# Altium footprint library SoM_Artix.PcbLib: 239 footprints (part 10 of 15)
Each footprint in its own frame and in the unit in brackets; x right, y up, seen from the top. Pads: shape width x height; smd on the part's side, far side on the other; paste and mask are expansions set on the pad; w line width, h text height; cw(c..) or ccw(c..) is an arc to the next point about the centre after c.
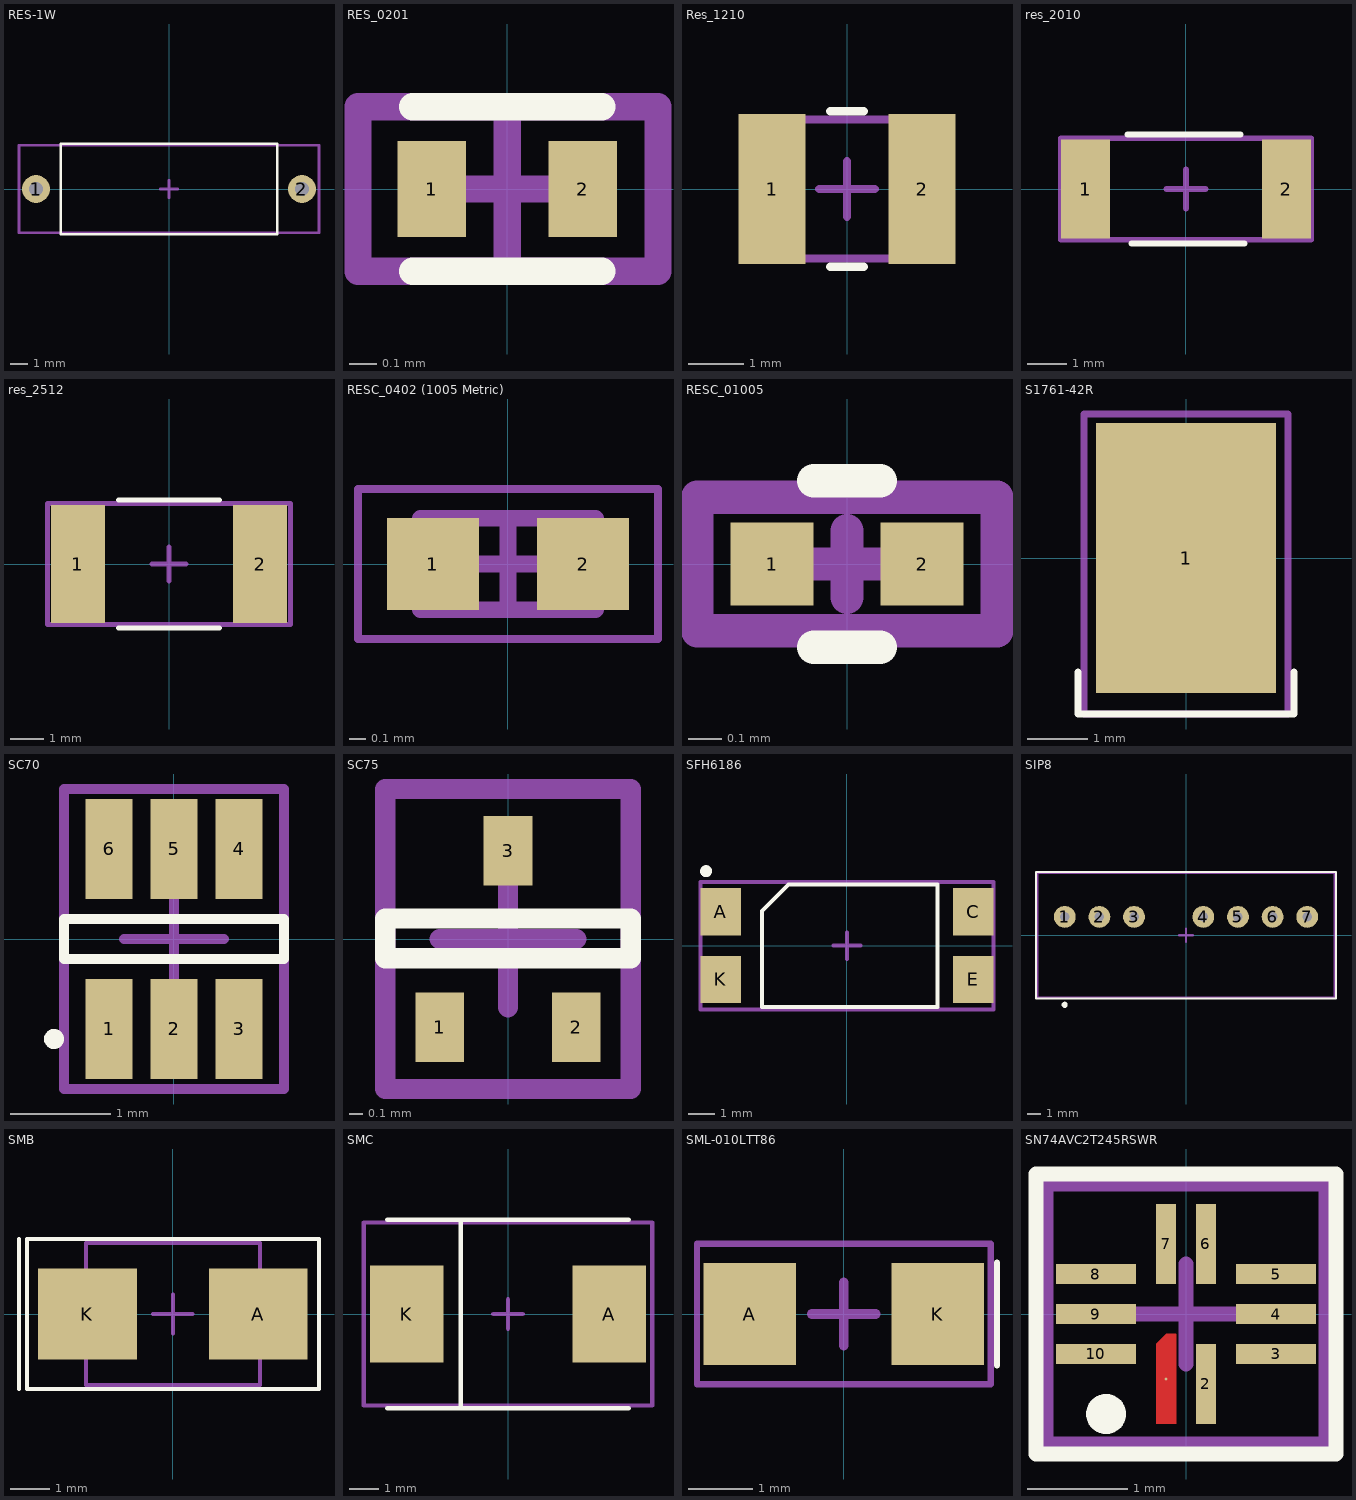
[diagram p9: the footprints below, top view; thin cyan lines are the x and y axes]

## RES-1W [mm]
pads (2):
  round 1.6 hole 0.8: 1(-7.625,0) 2(7.625,0)
Top Overlay:
  lines w0.15: -6.2,-2.6 6.2,-2.6 6.2,2.6 -6.2,2.6 -6.2,-2.6
Mechanical 13:
  lines w0.15: -0.5,0 0.5,0 ; 0,-0.5 0,0.5 ; -8.6,-2.5 -8.6,2.5 8.6,2.5 8.6,-2.5 -8.6,-2.5
3D body "User Library-RES-1W.STEP": height 5, standoff -3, extent -7.975,-2.503 7.965,2.497

## RES_0201 [mm]
pads (2):
  rect 0.25x0.35 smd mask+0.03: 1(-0.275,0) 2(0.275,0)
Top Overlay:
  lines w0.1: -0.345,-0.3 0.345,-0.3 ; -0.345,0.3 0.345,0.3
Mechanical 15:
  lines w0.1: -0.3,0 0.3,0 ; 0,-0.3 0,0.3 ; -0.545,-0.3 0.55,-0.3 0.55,0.3 -0.545,0.3 -0.545,-0.3
3D body "User Library-User Library-RES0201.step": height 0.15, standoff 0, extent -0.245,-0.15 0.355,0.15

## Res_1210 [mm]
height 1.8
pads (2):
  rect 1.2x2.7 smd: 1(-1.35,0) 2(1.35,0)
Top Overlay:
  lines w0.15: -0.3,-1.4 0.3,-1.4 ; -0.3,1.4 0.3,1.4
Mechanical 13:
  lines w0.15: -0.5,0 0.5,0 ; 0,-0.5 0,0.5 ; -1.6,-1.25 1.6,-1.25 1.6,1.25 -1.6,1.25 -1.6,-1.25
3D body "User Library-RESC3225X06N.step": height 0.55, standoff 0, extent -1.6,-1.25 1.6,1.25

## res_2010 [mm]
pads (2):
  rect 1.25x2.54 smd: 1(-2.575,0) 2(2.575,0)
Top Overlay:
  lines w0.15: -1.5,1.4 1.4,1.4 ; -1.4,-1.4 1.5,-1.4
Mechanical 13:
  lines w0.15: -0.5,0 0.5,0 ; 0,-0.5 0,0.5 ; -3.2,-1.3 3.2,-1.3 3.2,1.3 -3.2,1.3 -3.2,-1.3
3D body "User Library-CRS2010.step": height 0.56, standoff 0, extent -2.5,-1.25 2.5,1.25

## res_2512 [mm]
pads (2):
  rect 1.6x3.5 smd: 1(-2.7,0) 2(2.7,0)
Top Overlay:
  lines w0.15: -1.5,-1.9 1.5,-1.9 ; -1.5,1.9 1.5,1.9
Mechanical 13:
  lines w0.15: -0.5,0 0.5,0 ; 0,-0.5 0,0.5 ; -3.6,-1.8 3.6,-1.8 3.6,1.8 -3.6,1.8 -3.6,-1.8
3D body "User Library-Resistor SMD 2512.step": height 0.65, standoff 0, extent -3.2,-1.6 3.2,1.6

## RESC_0402 (1005 Metric) [mm]
height 0.4
pads (2):
  rect 0.55x0.55 smd: 1(-0.45,0) 2(0.45,0)
Mechanical 13:
  lines w0.1: -0.525,-0.275 -0.525,0.275 0.525,0.275 0.525,-0.275 -0.525,-0.275
Mechanical 15:
  lines w0.05: -0.9,-0.45 -0.9,0.45 0.9,0.45 0.9,-0.45 -0.9,-0.45
  lines w0.1: -0.275,0 0.275,0 ; 0,-0.275 0,0.275
3D body "RESC1005X04N.step": height 0.4, standoff 0, extent -0.525,-0.275 0.525,0.275

## RESC_01005 [mm]
pads (2):
  rect 0.25x0.25 smd mask+0.05: 1(-0.225,0) 2(0.225,0)
Top Overlay:
  lines w0.1: -0.1,-0.25 0.1,-0.25 ; -0.1,0.25 0.1,0.25
Mechanical 15:
  lines w0.1: -0.1,0 0.1,0 ; 0,-0.1 0,0.1 ; -0.45,-0.2 -0.45,0.2 0.45,0.2 0.45,-0.2 -0.45,-0.2
3D body "User Library-01005_resistor.step": height 0.14, standoff 0, extent -0.2,-0.1 0.2,0.1

## S1761-42R [mm] "3.50mm SMT Spring Contact"
pads (1):
  rect 3x4.5 smd: 1(0,0)
Top Overlay:
  lines w0.11: -1.8,-1.9 -1.8,-2.6 1.8,-2.6 1.8,-1.9
Mechanical 13:
  lines w0.11: -1,0 1,0 ; 0,-1 0,1 ; -1.7,-2.6 1.7,-2.6 1.7,2.4 -1.7,2.4 -1.7,-2.6
3D body "s1761-42r.stp": height 3.51, standoff -0.01, extent -1.25,-2.5 1.25,1.999

## SC70 [mm]
pads (6):
  rect 0.47x1 smd mask+0.05: 1(-0.65,-0.9) 2(0,-0.9) 3(0.65,-0.9) 4(0.65,0.9) 5(0,0.9) 6(-0.65,0.9)
Top Overlay:
  circle w0.1: c-1.2,-1 r0.05
  lines w0.1: -1.1,-0.2 1.1,-0.2 1.1,0.2 -1.1,0.2 -1.1,-0.2
Mechanical 15:
  lines w0.1: -0.5,0 0.5,0 ; 0,-0.5 0,0.5 ; -1.1,-1.5 -1.1,1.5 1.1,1.5 1.1,-1.5 -1.1,-1.5
3D body "User Library-sot363.step": height 1, standoff 0, extent -1.05,-1.15 1.05,1.15

## SC75 [mil]
pads (3):
  rect 14.02x20 smd: 1(-19.68,-25.49) 2(19.69,-25.49) 3(0,25.49)
Top Overlay:
  lines w5.91: -35.43,-5.51 35.43,-5.51 35.43,5.92 -35.43,5.92 -35.43,-5.51
Mechanical 15:
  lines w5.91: -19.68,0 19.68,0 ; 0,-19.68 0,19.68 ; -35.43,-43.31 -35.43,43.31 35.43,43.31 35.43,-43.31 -35.43,-43.31
3D body "User Library-SC-75A.STEP": height 27.67, standoff -0.25, extent -31.5,-31.1 31.5,31.89

## SFH6186 [mm]
height 4.1
pads (4):
  rect 1.52x1.78 smd: A(-4.75,1.27) C(4.75,1.27) E(4.75,-1.27) K(-4.75,-1.27)
Top Overlay:
  circle w0.25: c-5.3,2.8 r0.1
  lines w0.15: -3.2,-2.3 -3.2,1.3 -2.2,2.3 3.4,2.3 3.4,-2.3 -3.2,-2.3
Mechanical 13:
  lines w0.15: -0.5,0 0.5,0 ; 0,-0.5 0,0.5 ; -5.5,-2.4 5.5,-2.4 5.5,2.4 -5.5,2.4 -5.5,-2.4
3D body "User Library-PC817_Gullwing.STEP": height 3.85, standoff 0, extent -5,-2.29 5,2.29

## SIP8 [mm]
height 11
pads (7):
  round 1.6 hole 0.7: 1(-8.89,1.35) 2(-6.35,1.35) 3(-3.81,1.35) 4(1.27,1.35) 5(3.81,1.35) 6(6.35,1.35) 7(8.89,1.35)
Top Overlay:
  circle w0.25: c-8.9,-5.1 r0.1
  lines w0.15: -11,-4.65 11,-4.65 11,4.65 -11,4.65 -11,-4.65
Mechanical 13:
  lines w0.15: -0.5,0 0.5,0 ; 0,-0.5 0,0.5 ; -10.9,-4.55 10.9,-4.55 10.9,4.55 -10.9,4.55 -10.9,-4.55
3D body "User Library-RECOM_RS_Series.step": height 11.1, standoff -3.5, extent -11.1,-4.5 10.7,4.7

## SMB [mm]
pads (2):
  rect 2.5x2.3 smd: A(2.165,0) K(-2.165,0)
Top Overlay:
  lines w0.1: -3.9,-1.9 -3.9,1.9 ; -3.7,-1.9 3.7,-1.9 3.7,1.9 -3.7,1.9 -3.7,-1.9
Mechanical 13:
  lines w0.1: -0.5,0 0.5,0 ; 0,-0.5 0,0.5 ; -2.2,-1.8 -2.2,1.8 2.2,1.8 2.2,-1.8 -2.2,-1.8
3D body "User Library-DO-214AA SMB.step": height 2.3, standoff 0, extent -2.7,-1.8 2.7,1.8

## SMC [mm]
height 2.5
pads (2):
  rect 2.5x3.3 smd: A(3.45,0) K(-3.45,0)
Top Overlay:
  lines w0.15: -4.1,-3.2 4.1,-3.2 ; -4.1,3.2 4.1,3.2 ; -1.6,-3.2 -1.6,3.2
Mechanical 13:
  lines w0.15: -0.5,0 0.5,0 ; 0,-0.5 0,0.5 ; -4.9,-3.11 4.9,-3.11 4.9,3.11 -4.9,3.11 -4.9,-3.11
3D body "User Library-DIOM8261X24.step": height 2.35, standoff -0.02, extent -4.065,-3.05 4.065,3.05

## SML-010LTT86 [mm]
pads (2):
  rect 1.45x1.6 smd mask+0.05: A(-1.475,0) K(1.475,0)
Top Overlay:
  lines w0.1: 2.4,-0.8 2.4,0.8
Mechanical 15:
  lines w0.1: -2.3,-1.1 2.3,-1.1 2.3,1.1 -2.3,1.1 -2.3,-1.1
  lines w0.15: -0.5,0 0.5,0 ; 0,-0.5 0,0.5
3D body "LED_SML-01_ROM.step": height 1.5, standoff 0, extent -1.499,-1.019 1.499,1.019

## SN74AVC2T245RSWR [mm]
pads (10):
  round 0.025 smd mask+0.05: 1(-0.2,-0.65)
  rect 0.2x0.8 smd mask+0.05: 2(0.2,-0.7) 6(0.2,0.7) 7(-0.2,0.7)
  rect 0.8x0.2 smd mask+0.05: 3(0.9,-0.4) 4(0.9,0) 5(0.9,0.4) 8(-0.9,0.4) 9(-0.9,0) 10(-0.9,-0.4)
Top Layer:
  region: -0.3,-1.1 -0.1,-1.1 -0.1,-0.2 -0.2,-0.2 -0.3,-0.3
Top Overlay:
  circle w0.2: c-0.8,-1 r0.1
  lines w0.15: -1.5,-1.4 -1.5,1.4 1.5,1.4 1.5,-1.4 -1.5,-1.4
Mechanical 15:
  lines w0.15: -0.5,0 0.5,0 ; 0,-0.5 0,0.5 ; -1.4,-1.3 1.4,-1.3 1.4,1.3 -1.4,1.3 -1.4,-1.3
3D body "User Library-UQFN10 1_4x1_8mm 0_4 pitch with white mark.step": height 0.5, standoff 0, extent -0.9,-0.7 0.9,0.7